# Altium footprint library PCBKU.PcbLib: 190 footprints (part 10 of 12)
Each footprint in its own frame and in the unit in brackets; x right, y up, seen from the top. Pads: shape width x height; smd on the part's side, far side on the other; paste and mask are expansions set on the pad; w line width, h text height; cw(c..) or ccw(c..) is an arc to the next point about the centre after c.
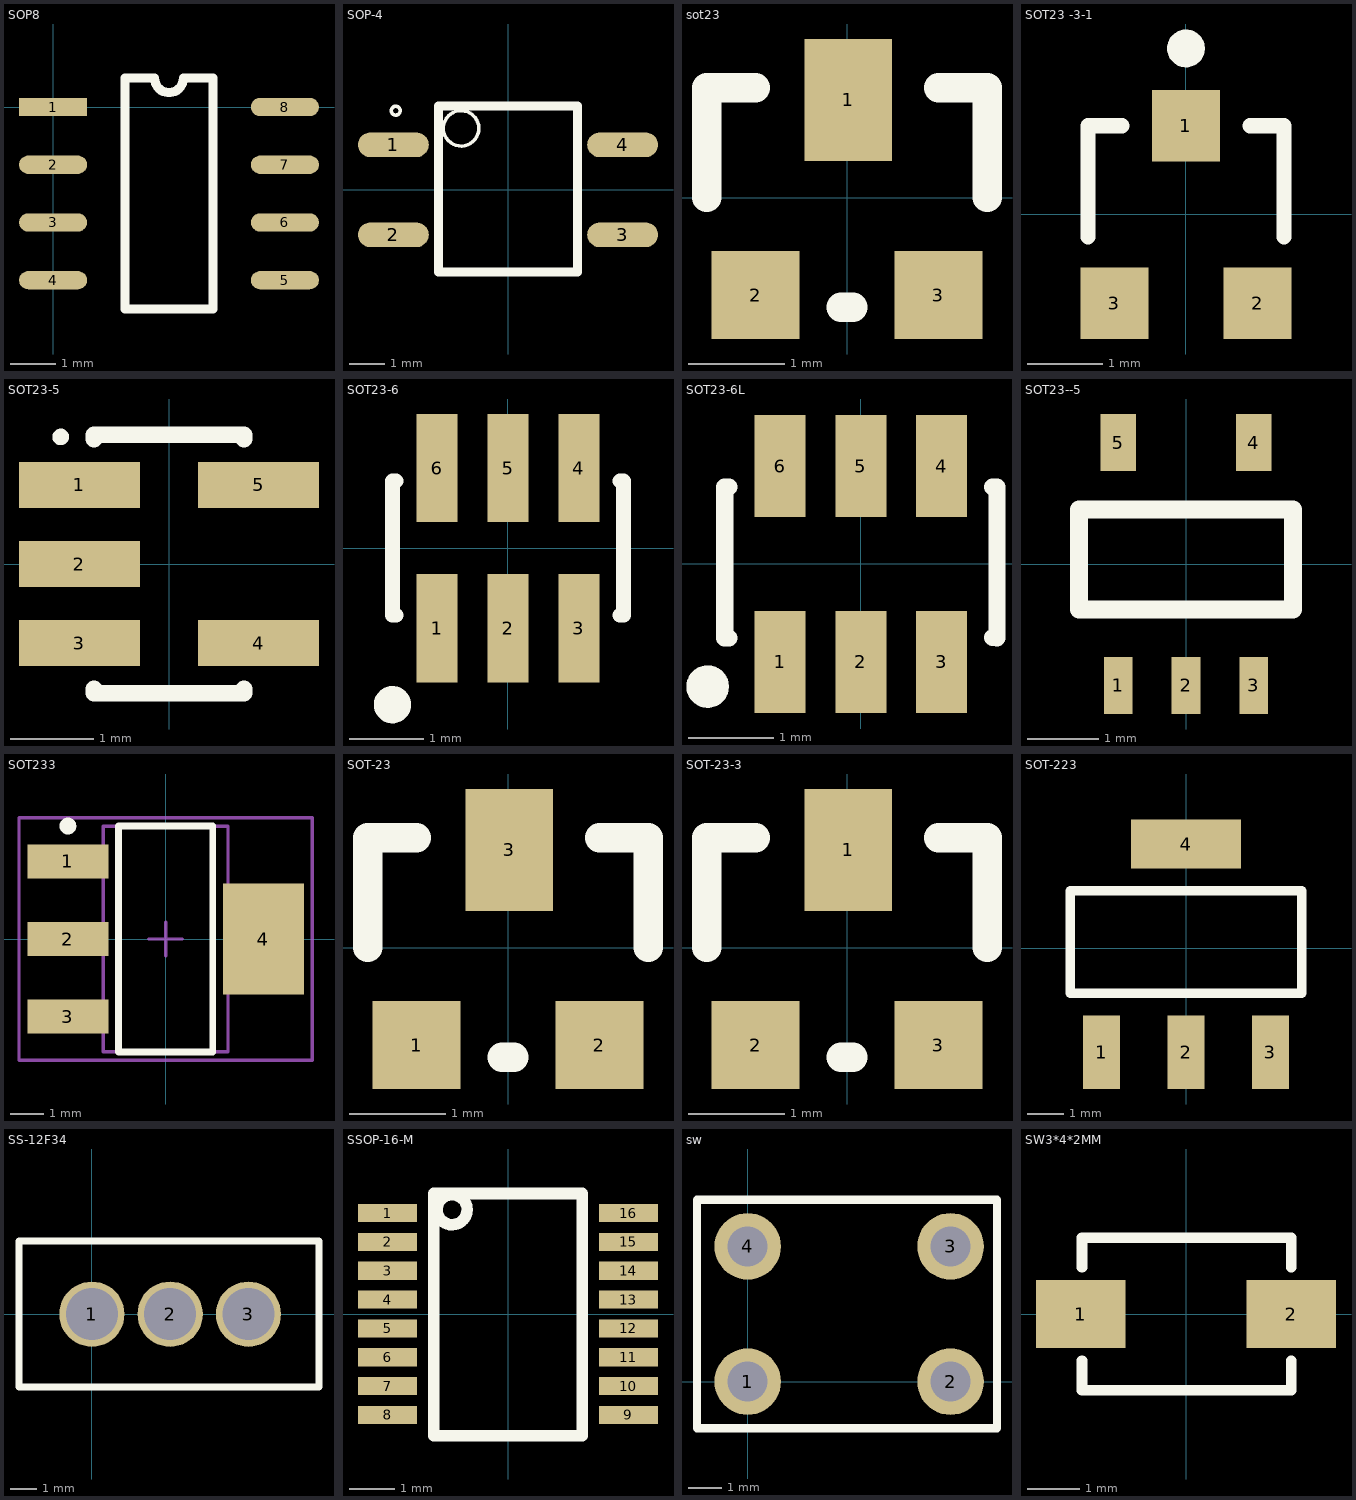
[diagram p9: the footprints below, top view; thin cyan lines are the x and y axes]

## SOP8 [mm]
pads (8):
  rect 1.5x0.4 smd: 1(0,0)
  oval 1.5x0.4 smd: 2(0,-1.27) 3(0,-2.54) 4(0,-3.81) 5(5.1,-3.81) 6(5.1,-2.54) 7(5.1,-1.27) 8(5.1,0)
Top Overlay:
  lines w0.2: 1.585,-4.445 1.585,0.635 2.232,0.635 ccw(c2.55,0.635) 2.867,0.635 3.515,0.635 3.515,-4.445 1.585,-4.445

## SOP-4 [mm]
height 1.1
pads (4):
  oval 2x0.7 smd: 1(-3.238,1.272) 2(-3.238,-1.271) 3(3.238,-1.271) 4(3.238,1.272)
Top Overlay:
  circle w0.1: c-3.173,2.235 r0.125
  circle w0.1: c-1.325,1.737 r0.5
  lines w0.25: -1.968,-2.327 -1.968,2.373 ; -1.968,2.372 1.931,2.372 ; -1.931,-2.327 1.968,-2.327 1.968,2.373

## sot23 [mil]
pads (3):
  rect 36x50 smd: 1(0.5,40)
  rect 36x36 smd: 2(-37.5,-40) 3(37.5,-40)
Top Overlay:
  lines w12: -57.5,0 -57.5,45 -37.5,45 ; -2.5,-45 2.5,-45 ; 37.5,45 57.5,45 57.5,0

## SOT23 -3-1 [mm] "SOT-23; 3 Leads; Body 3.1 x 2.5 mm, inc. leads (LxW max), Alternate Lead Configuration"
height 1.1
pads (3):
  rect 0.9x0.95 smd: 1(0,1.175) 2(0.95,-1.175) 3(-0.95,-1.175)
Top Overlay:
  circle w0.25: c0,2.2 r0.125
  lines w0.2: -1.3,-0.3 -1.3,1.175 -0.85,1.175 ; 0.85,1.175 1.3,1.175 1.3,-0.3
3D body: height 1.05, standoff -0.05, extent -1.473,-1.301 1.527,1.199

## SOT23-5 [mm]
pads (5):
  rect 1.45x0.55 smd: 1(-1.075,0.95) 2(-1.075,0) 3(-1.075,-0.95) 4(1.075,-0.95) 5(1.075,0.95)
Top Overlay:
  circle w0.1: c-1.3,1.525 r0.05
  lines w0.2: -0.9,-1.5 -0.9,-1.55 0.9,-1.55 0.9,-1.5 ; -0.9,1.5 -0.9,1.55 0.9,1.55 0.9,1.5
3D body: height 1.45, standoff 0.01, extent -1.549,-1.549 1.651,1.551

## SOT23-6 [mm]
pads (6):
  rect 0.55x1.45 smd: 1(-0.95,-1.075) 2(0,-1.075) 3(0.95,-1.075) 4(0.95,1.075) 5(0,1.075) 6(-0.95,1.075)
Top Overlay:
  circle w0.25: c-1.55,-2.1 r0.125
  lines w0.2: -1.5,-0.9 -1.55,-0.9 -1.55,0.9 -1.5,0.9 ; 1.5,-0.9 1.55,-0.9 1.55,0.9 1.5,0.9

## SOT23-6L [mm]
pads (6):
  rect 0.6x1.2 smd: 1(-0.95,-1.15) 2(0,-1.15) 3(0.95,-1.15) 4(0.95,1.15) 5(0.001,1.15) 6(-0.95,1.15)
Top Overlay:
  circle w0.25: c-1.801,-1.441 r0.125
  lines w0.2: -1.601,-0.871 -1.551,-0.871 ; -1.601,0.907 -1.551,0.907 ; 1.549,0.907 1.599,0.907 ; 1.55,-0.865 1.6,-0.865
  lines w0.203: -1.6,-0.865 -1.6,0.885 ; 1.6,-0.865 1.6,0.885
3D body: height 1.3, standoff -0.1, extent -1.549,-1.525 1.499,1.475

## SOT23--5 [mm]
pads (5):
  rect 0.4x0.8 smd: 1(-0.95,-1.7) 2(0,-1.7) 3(0.95,-1.7)
  rect 0.5x0.8 smd: 4(0.95,1.7) 5(-0.95,1.7)
Top Overlay:
  lines w0.254: -1.5,-0.635 1.5,-0.635 1.5,0.762 -1.5,0.762 -1.5,-0.635

## SOT233 [mm]
pads (4):
  rect 2.4x1 smd: 1(-2.9,2.3) 2(-2.9,0) 3(-2.9,-2.3)
  rect 2.4x3.3 smd: 4(2.9,0)
Top Overlay:
  circle w0.25: c-2.9,3.35 r0.125
  lines w0.2: -1.4,-3.35 -1.4,3.35 1.4,3.35 1.4,-3.35 -1.4,-3.35
Mechanical 13:
  lines w0.1: -1.85,-3.35 -1.85,3.35 1.85,3.35 1.85,-3.35 -1.85,-3.35
Mechanical 15:
  lines w0.1: -0.5,0 0.5,0 ; 0,-0.5 0,0.5 ; -4.35,-3.6 -4.35,3.6 4.35,3.6 4.35,-3.6 -4.35,-3.6
3D body: height 1.8, standoff 0, extent -1.85,-3.35 1.85,3.35

## SOT-23 [mil]
pads (3):
  rect 36x36 smd: 1(-37.5,-40) 2(37.5,-40)
  rect 36x50 smd: 3(0.5,40)
Top Overlay:
  lines w12: -57.5,0 -57.5,45 -37.5,45 ; -2.5,-45 2.5,-45 ; 37.5,45 57.5,45 57.5,0
3D body: height 41.34, standoff -1.97, extent -59.11,-49.21 59,49.21

## SOT-23-3 [mil]
pads (3):
  rect 36x50 smd: 1(0.5,40)
  rect 36x36 smd: 2(-37.5,-40) 3(37.5,-40)
Top Overlay:
  lines w12: -57.5,0 -57.5,45 -37.5,45 ; -2.5,-45 2.5,-45 ; 37.5,45 57.5,45 57.5,0
3D body: height 41.34, standoff -1.97, extent -60.06,-50.43 58.06,48

## SOT-223 [mm]
pads (4):
  rect 1x2 smd: 1(-2.3,-2.833) 2(0,-2.833) 3(2.3,-2.833)
  rect 3x1.33 smd: 4(0,2.833)
Top Overlay:
  lines w0.254: -3.15,-1.231 3.15,-1.231 3.15,1.563 -3.15,1.563 -3.15,-1.231
3D body: height 1.7, standoff 0.02, extent -3.25,-3.734 3.25,3.226

## SS-12F34 [mm]
pads (3):
  round 2.5 hole 2: 1(0,0) 2(3,0) 3(6,0)
Top Overlay:
  lines w0.254: -2.794,-2.794 8.706,-2.794 8.706,2.806 -2.794,2.806 -2.794,-2.794

## SSOP-16-M [mm]
pads (16):
  rect 1.3x0.4 smd: 1(-2.654,2.222) 2(-2.654,1.587) 3(-2.654,0.953) 4(-2.654,0.318) 5(-2.654,-0.318) 6(-2.654,-0.953) 7(-2.654,-1.587) 8(-2.654,-2.222) 9(2.654,-2.222) 10(2.654,-1.587) 11(2.654,-0.953) 12(2.654,-0.318) 13(2.654,0.318) 14(2.654,0.953) 15(2.654,1.587) 16(2.654,2.222)
Top Overlay:
  lines w0.254: -0.913,2.39 ccw(c-1.232,2.299) -0.901,2.299 ; -1.638,-2.68 1.638,-2.68 1.638,2.654 -1.638,2.654 -1.638,-2.68
3D body: height 1.7, standoff 0, extent -3.086,-2.476 3.111,2.502

## sw [mm]
pads (4):
  round 2 hole 1.2: 1(0,0) 2(6.096,0) 3(6.096,4.064) 4(0,4.064)
Top Overlay:
  lines w0.254: -1.524,-1.397 -1.524,5.461 7.493,5.461 7.493,-1.397 -1.524,-1.397

## SW3*4*2MM [mm]
pads (2):
  rect 1.7x1.3 smd: 1(-2.007,0) 2(2.007,0)
Top Overlay:
  lines w0.203: -1.981,-0.891 -1.981,-1.45 2.007,-1.45 2.007,-0.891 ; -1.981,0.891 -1.981,1.45 2.007,1.45 2.007,0.891